# Altium footprint library B-NT_CONNECT.PcbLib: 109 footprints (part 1 of 7)
Each footprint in its own frame and in the unit in brackets; x right, y up, seen from the top. Pads: shape width x height; smd on the part's side, far side on the other; paste and mask are expansions set on the pad; w line width, h text height; cw(c..) or ccw(c..) is an arc to the next point about the centre after c.
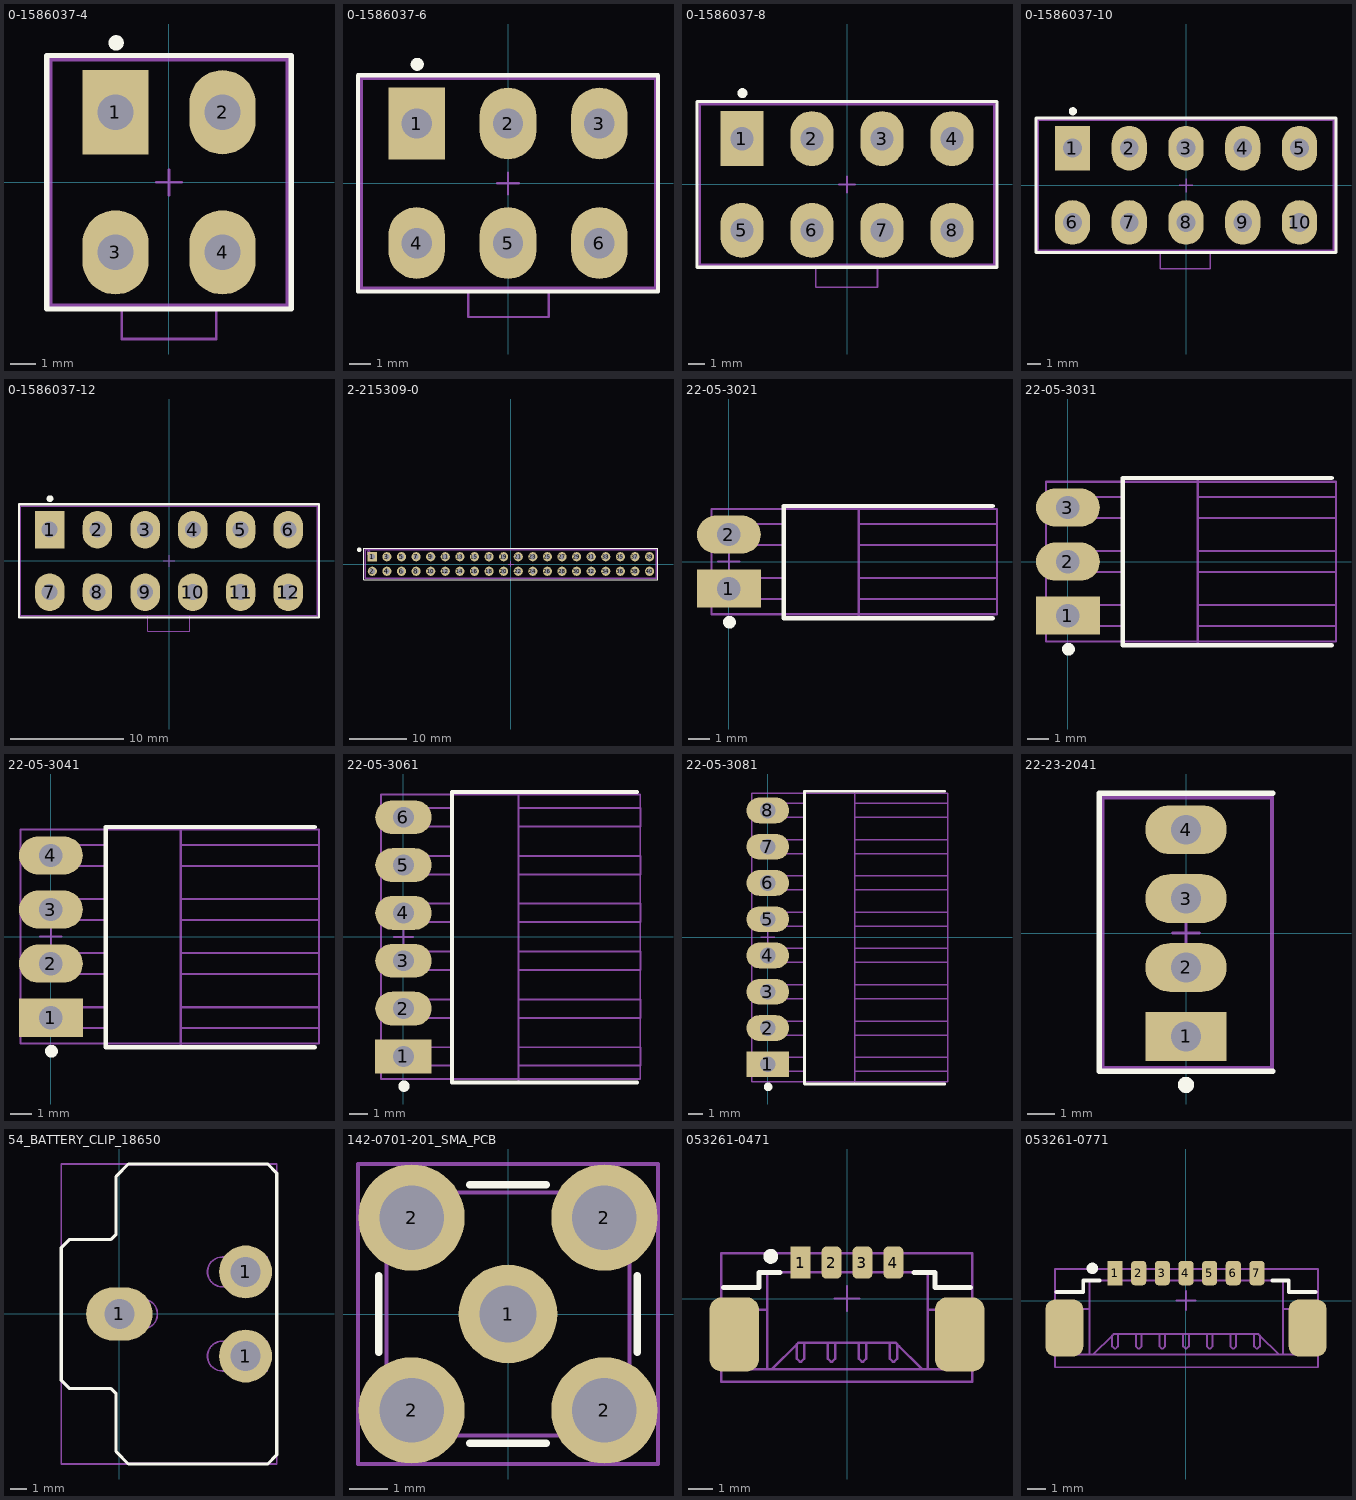
[diagram p0: the footprints below, top view; thin cyan lines are the x and y axes]

## 0-1586037-4 [mm]
height 12.8
pads (4):
  rect 2.6x3.3 hole 1.4: 1(-2.1,2.75)
  oval 2.6x3.3 hole 1.4: 2(2.1,2.75) 3(-2.1,-2.75) 4(2.1,-2.75)
Top Overlay:
  circle w0.3: c-2.075,5.475 r0.15
  lines w0.2: -4.8,-4.975 4.8,-4.975 4.8,4.975 -4.8,4.975 -4.8,-4.975
M3 Top Assy:
  lines w0.1: -1.85,-4.85 -1.85,-6.15 0.425,-6.15 1.85,-6.15 1.85,-4.85 ; -4.675,-4.85 4.675,-4.85 4.675,4.85 -4.675,4.85 -4.675,-4.85 ; -3.065,-3.675 -3.065,-1.825 -1.215,-1.825 -1.215,-3.675 -3.065,-3.675 ; -3.065,1.795 -1.215,1.795 -1.215,3.645 -3.065,3.645 -3.065,1.795 ; -2.365,-2.995 -2.365,-2.495 -1.865,-2.495 -1.865,-2.995 -2.365,-2.995 ; -2.365,2.475 -1.865,2.475 -1.865,2.975 -2.365,2.975 -2.365,2.475 ; 1.15,-3.685 1.15,-1.835 3,-1.835 3,-3.685 1.15,-3.685 ; 1.16,1.82 1.16,3.67 3.01,3.67 3.01,1.82 1.16,1.82 ; 1.85,-3.005 2.35,-3.005 2.35,-2.505 1.85,-2.505 1.85,-3.005 ; 1.86,2.5 1.86,3 2.36,3 2.36,2.5 1.86,2.5
M8 Top Brd Anno:
  lines w0.1: -0.5,0 0.5,0 ; 0,-0.5 0,0.5 ; -4.625,-4.8 -4.625,4.8 4.625,4.8 4.625,-4.8 -4.625,-4.8
3D body "0-1586037-4.STEP": height 12.8, standoff -3.5, extent -4.775,-6.125 4.825,4.925

## 0-1586037-6 [mm]
height 12.8
pads (6):
  rect 2.6x3.3 hole 1.4: 1(-4.2,2.75)
  oval 2.6x3.3 hole 1.4: 2(0,2.75) 3(4.2,2.75) 4(-4.2,-2.75) 5(0,-2.75) 6(4.2,-2.75)
Top Overlay:
  circle w0.3: c-4.175,5.475 r0.15
  lines w0.2: -6.9,-4.975 6.9,-4.975 6.9,4.975 -6.9,4.975 -6.9,-4.975
M3 Top Assy:
  lines w0.1: -1.825,-4.85 -1.825,-6.15 0.45,-6.15 1.875,-6.15 1.875,-4.85 ; -6.775,-4.85 6.825,-4.85 6.825,4.85 -6.775,4.85 -6.775,-4.85 ; -5.165,-3.675 -5.165,-1.825 -3.315,-1.825 -3.315,-3.675 -5.165,-3.675 ; -5.165,1.795 -3.315,1.795 -3.315,3.645 -5.165,3.645 -5.165,1.795 ; -4.465,-2.995 -4.465,-2.495 -3.965,-2.495 -3.965,-2.995 -4.465,-2.995 ; -4.465,2.475 -3.965,2.475 -3.965,2.975 -4.465,2.975 -4.465,2.475 ; -0.95,-3.685 -0.95,-1.835 0.9,-1.835 0.9,-3.685 -0.95,-3.685 ; -0.94,1.82 -0.94,3.67 0.91,3.67 0.91,1.82 -0.94,1.82 ; -0.25,-3.005 0.25,-3.005 0.25,-2.505 -0.25,-2.505 -0.25,-3.005 ; -0.24,2.5 -0.24,3 0.26,3 0.26,2.5 -0.24,2.5 ; 3.25,-3.685 5.1,-3.685 5.1,-1.835 3.25,-1.835 3.25,-3.685 ; 3.26,1.82 5.11,1.82 5.11,3.67 3.26,3.67 3.26,1.82 ; 3.95,-3.005 3.95,-2.505 4.45,-2.505 4.45,-3.005 3.95,-3.005 ; 3.96,2.5 4.46,2.5 4.46,3 3.96,3 3.96,2.5
M8 Top Brd Anno:
  lines w0.1: -0.5,0 0.5,0 ; 0,-0.5 0,0.5 ; -6.725,-4.8 -6.725,4.8 6.775,4.8 6.775,-4.8 -6.725,-4.8
3D body "0-1586037-6.SLDPRT": height 12.8, standoff -3.5, extent -6.9,-6.2 6.9,4.85

## 0-1586037-8 [mm]
height 12.8
pads (8):
  rect 2.6x3.3 hole 1.4: 1(-6.3,2.75)
  oval 2.6x3.3 hole 1.4: 2(-2.1,2.75) 3(2.1,2.75) 4(6.3,2.75) 5(-6.3,-2.75) 6(-2.1,-2.75) 7(2.1,-2.75) 8(6.3,-2.75)
Top Overlay:
  circle w0.3: c-6.275,5.475 r0.15
  lines w0.2: 8.975,4.975 -9,4.975 -9,-4.975 9,-4.975 9,4.975
M3 Top Assy:
  lines w0.1: -1.875,-4.875 -1.875,-6.175 0.4,-6.175 1.825,-6.175 1.825,-4.875 ; 8.925,-4.85 8.925,4.85 ; -8.875,-4.85 -8.875,4.85 8.85,4.85 8.85,-4.85 -8.875,-4.85 ; -7.265,-3.675 -5.415,-3.675 -5.415,-1.825 -7.265,-1.825 -7.265,-3.675 ; -7.265,1.795 -7.265,3.645 -5.415,3.645 -5.415,1.795 -7.265,1.795 ; -6.565,-2.995 -6.065,-2.995 -6.065,-2.495 -6.565,-2.495 -6.565,-2.995 ; -6.565,2.475 -6.565,2.975 -6.065,2.975 -6.065,2.475 -6.565,2.475 ; -3.05,-3.685 -1.2,-3.685 -1.2,-1.835 -3.05,-1.835 -3.05,-3.685 ; -3.04,1.82 -1.19,1.82 -1.19,3.67 -3.04,3.67 -3.04,1.82 ; -2.35,-3.005 -2.35,-2.505 -1.85,-2.505 -1.85,-3.005 -2.35,-3.005 ; -2.34,2.5 -1.84,2.5 -1.84,3 -2.34,3 -2.34,2.5 ; 1.15,-3.685 1.15,-1.835 3,-1.835 3,-3.685 1.15,-3.685 ; 1.16,1.82 1.16,3.67 3.01,3.67 3.01,1.82 1.16,1.82 ; 1.85,-3.005 2.35,-3.005 2.35,-2.505 1.85,-2.505 1.85,-3.005 ; 1.86,2.5 1.86,3 2.36,3 2.36,2.5 1.86,2.5 ; 5.35,-3.685 7.2,-3.685 7.2,-1.835 5.35,-1.835 5.35,-3.685 ; 5.36,1.82 7.21,1.82 7.21,3.67 5.36,3.67 5.36,1.82 ; 6.05,-3.005 6.05,-2.505 6.55,-2.505 6.55,-3.005 6.05,-3.005 ; 6.06,2.5 6.56,2.5 6.56,3 6.06,3 6.06,2.5
M8 Top Brd Anno:
  lines w0.1: -0.5,0 0.5,0 ; 0,-0.5 0,0.5 ; -8.825,-4.8 -8.825,4.8 8.8,4.8 8.8,-4.8 -8.825,-4.8
3D body "0-1586037-8.SLDPRT": height 12.8, standoff -3.5, extent -9,-6.175 9,4.875

## 0-1586037-10 [mm]
height 12.8
pads (10):
  rect 2.6x3.3 hole 1.4: 1(-8.4,2.75)
  oval 2.6x3.3 hole 1.4: 2(-4.2,2.75) 3(0,2.75) 4(4.2,2.75) 5(8.4,2.75) 6(-8.4,-2.75) 7(-4.2,-2.75) 8(0,-2.75) 9(4.2,-2.75) 10(8.4,-2.75)
Top Overlay:
  circle w0.3: c-8.375,5.475 r0.15
  lines w0.2: 11.025,-4.975 -11.1,-4.975 -11.1,4.975 11.075,4.975 ; 11.1,-4.975 11.1,4.975
M3 Top Assy:
  lines w0.1: -1.912,-4.875 -1.912,-6.175 0.363,-6.175 1.788,-6.175 1.788,-4.875 ; 11.025,-4.85 11.025,4.85 ; -10.975,-4.85 -10.975,4.85 10.95,4.85 10.95,-4.85 -10.975,-4.85 ; -9.365,-3.675 -7.515,-3.675 -7.515,-1.825 -9.365,-1.825 -9.365,-3.675 ; -9.365,1.795 -9.365,3.645 -7.515,3.645 -7.515,1.795 -9.365,1.795 ; -8.665,-2.995 -8.165,-2.995 -8.165,-2.495 -8.665,-2.495 -8.665,-2.995 ; -8.665,2.475 -8.665,2.975 -8.165,2.975 -8.165,2.475 -8.665,2.475 ; -5.15,-3.685 -3.3,-3.685 -3.3,-1.835 -5.15,-1.835 -5.15,-3.685 ; -5.14,1.82 -3.29,1.82 -3.29,3.67 -5.14,3.67 -5.14,1.82 ; -4.45,-3.005 -4.45,-2.505 -3.95,-2.505 -3.95,-3.005 -4.45,-3.005 ; -4.44,2.5 -3.94,2.5 -3.94,3 -4.44,3 -4.44,2.5 ; -0.95,-3.685 -0.95,-1.835 0.9,-1.835 0.9,-3.685 -0.95,-3.685 ; -0.94,1.82 -0.94,3.67 0.91,3.67 0.91,1.82 -0.94,1.82 ; -0.25,-3.005 0.25,-3.005 0.25,-2.505 -0.25,-2.505 -0.25,-3.005 ; -0.24,2.5 -0.24,3 0.26,3 0.26,2.5 -0.24,2.5 ; 3.25,-3.685 5.1,-3.685 5.1,-1.835 3.25,-1.835 3.25,-3.685 ; 3.26,1.82 5.11,1.82 5.11,3.67 3.26,3.67 3.26,1.82 ; 3.95,-3.005 3.95,-2.505 4.45,-2.505 4.45,-3.005 3.95,-3.005 ; 3.96,2.5 4.46,2.5 4.46,3 3.96,3 3.96,2.5 ; 7.45,-3.685 7.45,-1.835 9.3,-1.835 9.3,-3.685 7.45,-3.685 ; 7.46,1.82 7.46,3.67 9.31,3.67 9.31,1.82 7.46,1.82 ; 8.15,-3.005 8.65,-3.005 8.65,-2.505 8.15,-2.505 8.15,-3.005 ; 8.16,2.5 8.16,3 8.66,3 8.66,2.5 8.16,2.5
M8 Top Brd Anno:
  lines w0.1: -0.5,0 0.5,0 ; 0,-0.5 0,0.5 ; -10.925,-4.8 10.9,-4.8 10.9,4.8 -10.925,4.8 -10.925,-4.8
3D body "1-1586037-0.SLDPRT": height 12.8, standoff -3.5, extent -11.075,-6.2 11.125,4.85

## 0-1586037-12 [mm]
height 12.8
pads (12):
  rect 2.6x3.3 hole 1.4: 1(-10.5,2.75)
  oval 2.6x3.3 hole 1.4: 2(-6.3,2.75) 3(-2.1,2.75) 4(2.1,2.75) 5(6.3,2.75) 6(10.5,2.75) 7(-10.5,-2.75) 8(-6.3,-2.75) 9(-2.1,-2.75) 10(2.1,-2.75) 11(6.3,-2.75) 12(10.5,-2.75)
Top Overlay:
  circle w0.3: c-10.475,5.475 r0.15
  lines w0.2: -13.2,-4.975 -13.2,4.975 13.2,4.975 13.2,-4.975 -13.2,-4.975
M3 Top Assy:
  lines w0.1: -1.875,-4.875 -1.875,-6.175 0.4,-6.175 1.825,-6.175 1.825,-4.875 ; -13.075,-4.85 -13.075,4.85 13.1,4.85 13.1,-4.85 -13.075,-4.85 ; -11.465,-3.675 -9.615,-3.675 -9.615,-1.825 -11.465,-1.825 -11.465,-3.675 ; -11.465,1.795 -11.465,3.645 -9.615,3.645 -9.615,1.795 -11.465,1.795 ; -10.765,-2.995 -10.265,-2.995 -10.265,-2.495 -10.765,-2.495 -10.765,-2.995 ; -10.765,2.475 -10.765,2.975 -10.265,2.975 -10.265,2.475 -10.765,2.475 ; -7.25,-3.685 -5.4,-3.685 -5.4,-1.835 -7.25,-1.835 -7.25,-3.685 ; -7.24,1.82 -5.39,1.82 -5.39,3.67 -7.24,3.67 -7.24,1.82 ; -6.55,-3.005 -6.55,-2.505 -6.05,-2.505 -6.05,-3.005 -6.55,-3.005 ; -6.54,2.5 -6.04,2.5 -6.04,3 -6.54,3 -6.54,2.5 ; -3.05,-3.685 -3.05,-1.835 -1.2,-1.835 -1.2,-3.685 -3.05,-3.685 ; -3.04,1.82 -3.04,3.67 -1.19,3.67 -1.19,1.82 -3.04,1.82 ; -2.35,-3.005 -1.85,-3.005 -1.85,-2.505 -2.35,-2.505 -2.35,-3.005 ; -2.34,2.5 -2.34,3 -1.84,3 -1.84,2.5 -2.34,2.5 ; 1.15,-3.685 3,-3.685 3,-1.835 1.15,-1.835 1.15,-3.685 ; 1.16,1.82 3.01,1.82 3.01,3.67 1.16,3.67 1.16,1.82 ; 1.85,-3.005 1.85,-2.505 2.35,-2.505 2.35,-3.005 1.85,-3.005 ; 1.86,2.5 2.36,2.5 2.36,3 1.86,3 1.86,2.5 ; 5.35,-3.685 5.35,-1.835 7.2,-1.835 7.2,-3.685 5.35,-3.685 ; 5.36,1.82 5.36,3.67 7.21,3.67 7.21,1.82 5.36,1.82 ; 6.05,-3.005 6.55,-3.005 6.55,-2.505 6.05,-2.505 6.05,-3.005 ; 6.06,2.5 6.06,3 6.56,3 6.56,2.5 6.06,2.5 ; 9.55,-3.685 11.4,-3.685 11.4,-1.835 9.55,-1.835 9.55,-3.685 ; 9.56,1.82 11.41,1.82 11.41,3.67 9.56,3.67 9.56,1.82 ; 10.25,-3.005 10.25,-2.505 10.75,-2.505 10.75,-3.005 10.25,-3.005 ; 10.26,2.5 10.76,2.5 10.76,3 10.26,3 10.26,2.5
M8 Top Brd Anno:
  lines w0.1: -0.5,0 0.5,0 ; 0,-0.5 0,0.5 ; -13.025,-4.8 -13.025,4.8 13.025,4.8 13.025,-4.8 -13.025,-4.8
3D body "1-1586037-2.SLDPRT": height 12.8, standoff -3.5, extent -13.175,-6.175 13.225,4.875

## 2-215309-0 [mm] "Body 5.06x50.8"
height 8.5
pads (40):
  rect 1.6x1.6 hole 0.9: 1(-24.13,1.27)
  round 1.6 hole 0.9: 2(-24.13,-1.27) 3(-21.59,1.27) 4(-21.59,-1.27) 5(-19.05,1.27) 6(-19.05,-1.27) 7(-16.51,1.27) 8(-16.51,-1.27) 9(-13.97,1.27) 10(-13.97,-1.27) 11(-11.43,1.27) 12(-11.43,-1.27) 13(-8.89,1.27) 14(-8.89,-1.27) 15(-6.35,1.27) 16(-6.35,-1.27) 17(-3.81,1.27) 18(-3.81,-1.27) 19(-1.27,1.27) 20(-1.27,-1.27) 21(1.27,1.27) 22(1.27,-1.27) 23(3.81,1.27) 24(3.81,-1.27) 25(6.35,1.27) 26(6.35,-1.27) 27(8.89,1.27) 28(8.89,-1.27) 29(11.43,1.27) 30(11.43,-1.27) 31(13.97,1.27) 32(13.97,-1.27) 33(16.51,1.27) 34(16.51,-1.27) 35(19.05,1.27) 36(19.05,-1.27) 37(21.59,1.27) 38(21.59,-1.27) 39(24.13,1.27) 40(24.13,-1.27)
Top Overlay:
  circle w0.4: c-26.425,2.475 r0.2
  lines w0.2: -25.6,-2.725 25.6,-2.725 25.6,2.725 -25.6,2.725 -25.6,-2.725
Bottom Overlay:
  circle w0.4: c-26.412,2.47 r0.2
M3 Top Assy:
  circle w0.2: c-24.75,1.9 r0.3
  lines w0.2: -25.4,-2.52 25.4,-2.52 25.4,2.54 -25.4,2.54 -25.4,-2.52
M8 Top Brd Anno:
  lines w0.1: -0.5,0 0.5,0 ; 0,-0.5 0,0.5 ; -25.3,-2.425 25.3,-2.425 25.3,2.45 -25.3,2.45 -25.3,-2.425
3D body: height 0.25, standoff 0, extent 24.13,-1.27 24.384,-1.016
3D body "c-2-215309-0-e-3d.stp": height 8.5, standoff -3, extent -25.4,-2.53 25.4,2.53

## 22-05-3021 [mm]
height 6.5
pads (2):
  rect 3x1.8 hole 1.1: 1(0,-1.27)
  oval 3x1.8 hole 1.1: 2(0,1.27)
Top Overlay:
  circle w0.3: c0.025,-2.85 r0.15
  lines w0.2: 12.4,-2.66 2.575,-2.66 2.575,2.61 12.4,2.61
M3 Top Assy:
  lines w0.1: 2.575,-1.76 -0.4,-1.76 -0.4,-0.78 2.575,-0.78 ; 2.575,0.78 -0.4,0.78 -0.4,1.76 2.575,1.76 ; 6.1,-1.76 12.6,-1.76 12.6,-0.78 6.1,-0.78 ; 6.1,0.78 12.6,0.78 12.6,1.76 6.1,1.76 ; 2.575,-2.66 6.1,-2.66 6.1,2.66 2.575,2.66 2.575,-2.66
M8 Top Brd Anno:
  lines w0.1: -0.5,0 0.5,0 ; 0,-0.5 0,0.5 ; -0.825,-2.475 12.6,-2.475 12.6,2.475 -0.825,2.475 -0.825,-2.475
3D body "022053021.STEP": height 6.38, standoff -3.56, extent -0.335,-2.464 12.593,2.464

## 22-05-3031 [mm]
height 6.5
pads (3):
  rect 3x1.8 hole 1.1: 1(0,-2.54)
  oval 3x1.8 hole 1.1: 2(0,0) 3(0,2.54)
Top Overlay:
  circle w0.3: c0.025,-4.12 r0.15
  lines w0.2: 12.4,-3.93 2.575,-3.93 2.575,3.93 12.4,3.93
M3 Top Assy:
  lines w0.1: 2.575,-3.03 -0.4,-3.03 -0.4,-2.05 2.575,-2.05 ; 2.575,-0.49 -0.4,-0.49 -0.4,0.49 2.575,0.49 ; 2.575,2.05 -0.4,2.05 -0.4,3.03 2.575,3.03 ; 6.1,-3.03 12.6,-3.03 12.6,-2.05 6.1,-2.05 ; 6.1,-0.49 12.6,-0.49 12.6,0.49 6.1,0.49 ; 6.1,2.05 12.6,2.05 12.6,3.03 6.1,3.03 ; 2.575,-3.93 2.575,3.93 6.1,3.93 6.1,-3.93 2.575,-3.93
M8 Top Brd Anno:
  lines w0.1: -0.5,0 0.5,0 ; 0,-0.5 0,0.5 ; -1.025,-3.75 -1.025,3.75 12.6,3.75 12.6,-3.75 -1.025,-3.75
3D body "022053031.STEP": height 6.38, standoff -3.56, extent -0.335,-3.734 12.593,3.734

## 22-05-3041 [mm]
height 6.5
pads (4):
  rect 3x1.8 hole 1.1: 1(0,-3.81)
  oval 3x1.8 hole 1.1: 2(0,-1.27) 3(0,1.27) 4(0,3.81)
Top Overlay:
  circle w0.3: c0.025,-5.39 r0.15
  lines w0.2: 12.4,-5.2 2.575,-5.2 2.575,5.15 12.4,5.15
M3 Top Assy:
  lines w0.1: 2.575,-4.3 -0.4,-4.3 -0.4,-3.32 2.575,-3.32 ; 2.575,-1.76 -0.4,-1.76 -0.4,-0.78 2.575,-0.78 ; 2.575,0.78 -0.4,0.78 -0.4,1.76 2.575,1.76 ; 2.575,3.32 -0.4,3.32 -0.4,4.3 2.575,4.3 ; 6.1,-4.3 12.6,-4.3 12.6,-3.32 6.1,-3.32 ; 6.1,-1.76 12.6,-1.76 12.6,-0.78 6.1,-0.78 ; 6.1,0.78 12.6,0.78 12.6,1.76 6.1,1.76 ; 6.1,3.32 12.6,3.32 12.6,4.3 6.1,4.3 ; 2.575,-5.2 2.575,5.2 6.1,5.2 6.1,-5.2 2.575,-5.2
M8 Top Brd Anno:
  lines w0.1: -0.5,0 0.5,0 ; 0,-0.5 0,0.5 ; -1.425,-5.025 12.6,-5.025 12.6,5.025 -1.425,5.025 -1.425,-5.025
3D body "022053041.STEP": height 6.38, standoff -3.56, extent -0.335,-5.004 12.593,5.004

## 22-05-3061 [mm]
height 6.5
pads (6):
  rect 3x1.8 hole 1.1: 1(0,-6.35)
  oval 3x1.8 hole 1.1: 2(0,-3.81) 3(0,-1.27) 4(0,1.27) 5(0,3.81) 6(0,6.35)
Top Overlay:
  circle w0.3: c0.025,-7.93 r0.15
  lines w0.2: 12.4,-7.74 2.575,-7.74 2.575,7.69 12.4,7.69
M3 Top Assy:
  lines w0.1: 2.575,-6.84 -0.4,-6.84 -0.4,-5.86 2.575,-5.86 ; 2.575,-4.3 -0.4,-4.3 -0.4,-3.32 2.575,-3.32 ; 2.575,-1.76 -0.4,-1.76 -0.4,-0.78 2.575,-0.78 ; 2.575,0.78 -0.4,0.78 -0.4,1.76 2.575,1.76 ; 2.575,3.32 -0.4,3.32 -0.4,4.3 2.575,4.3 ; 2.575,5.86 -0.4,5.86 -0.4,6.84 2.575,6.84 ; 6.1,-6.84 12.6,-6.84 12.6,-5.86 6.1,-5.86 ; 6.1,-4.3 12.6,-4.3 12.6,-3.32 6.1,-3.32 ; 6.1,-1.76 12.6,-1.76 12.6,-0.78 6.1,-0.78 ; 6.1,0.78 12.6,0.78 12.6,1.76 6.1,1.76 ; 6.1,3.32 12.6,3.32 12.6,4.3 6.1,4.3 ; 6.1,5.86 12.6,5.86 12.6,6.84 6.1,6.84 ; 2.575,-7.74 2.575,7.74 6.1,7.74 6.1,-7.74 2.575,-7.74
M8 Top Brd Anno:
  lines w0.1: -0.5,0 0.5,0 ; 0,-0.5 0,0.5 ; -1.2,-7.55 12.575,-7.55 12.575,7.55 -1.2,7.55 -1.2,-7.55
3D body "022053061.STEP": height 6.38, standoff -3.56, extent -0.336,-7.544 12.593,7.544

## 22-05-3081 [mm]
height 6.5
pads (8):
  rect 3x1.8 hole 1.1: 1(0,-8.89)
  oval 3x1.8 hole 1.1: 2(0,-6.35) 3(0,-3.81) 4(0,-1.27) 5(0,1.27) 6(0,3.81) 7(0,6.35) 8(0,8.89)
Top Overlay:
  circle w0.3: c0.025,-10.47 r0.15
  lines w0.2: 12.4,-10.28 2.575,-10.28 2.575,10.23 12.4,10.23
M3 Top Assy:
  lines w0.1: 2.575,-9.38 -0.4,-9.38 -0.4,-8.4 2.575,-8.4 ; 2.575,-6.84 -0.4,-6.84 -0.4,-5.86 2.575,-5.86 ; 2.575,-4.3 -0.4,-4.3 -0.4,-3.32 2.575,-3.32 ; 2.575,-1.76 -0.4,-1.76 -0.4,-0.78 2.575,-0.78 ; 2.575,0.78 -0.4,0.78 -0.4,1.76 2.575,1.76 ; 2.575,3.32 -0.4,3.32 -0.4,4.3 2.575,4.3 ; 2.575,5.86 -0.4,5.86 -0.4,6.84 2.575,6.84 ; 2.575,8.4 -0.4,8.4 -0.4,9.38 2.575,9.38 ; 2.575,10.23 2.575,-10.28 6.1,-10.28 6.1,10.28 2.575,10.28 ; 6.1,-9.38 12.6,-9.38 12.6,-8.4 6.1,-8.4 ; 6.1,-6.84 12.6,-6.84 12.6,-5.86 6.1,-5.86 ; 6.1,-4.3 12.6,-4.3 12.6,-3.32 6.1,-3.32 ; 6.1,-1.76 12.6,-1.76 12.6,-0.78 6.1,-0.78 ; 6.1,0.78 12.6,0.78 12.6,1.76 6.1,1.76 ; 6.1,3.32 12.6,3.32 12.6,4.3 6.1,4.3 ; 6.1,5.86 12.6,5.86 12.6,6.84 6.1,6.84 ; 6.1,8.4 12.6,8.4 12.6,9.38 6.1,9.38
M8 Top Brd Anno:
  lines w0.1: -0.5,0 0.5,0 ; 0,-0.5 0,0.5 ; -1.125,-10.1 12.6,-10.1 12.6,10.1 -1.125,10.1 -1.125,-10.1
3D body "022053081.STEP": height 6.38, standoff -3.56, extent -0.335,-10.084 12.593,10.084

## 22-23-2041 [mm]
height 10.67
pads (4):
  rect 3x1.8 hole 1.1: 1(0,-3.81)
  oval 3x1.8 hole 1.1: 2(0,-1.27) 3(0,1.27) 4(0,3.81)
Top Overlay:
  circle w0.3: c0,-5.6 r0.15
  lines w0.2: 3.2,-5.1 -3.2,-5.1 -3.2,5.15 3.2,5.15
M3 Top Assy:
  lines w0.1: -3.1,-5 3.2,-5 3.2,5 -3.1,5 -3.1,-5
M8 Top Brd Anno:
  lines w0.1: -0.5,0 0.5,0 ; 0,-0.5 0,0.5 ; -3.05,-4.95 3.15,-4.95 3.15,4.925 3.15,4.975 -3.05,4.975 -3.05,-4.95
3D body "022232041.stp": height 10.61, standoff -3.61, extent -3.099,-5.004 3.251,5.004
3D body: height 1, standoff -11.5, extent 0,0 0,0

## 54_BATTERY_CLIP_18650 [mm]
pads (3):
  oval 4x3.2 hole 1.8: 1(0,0)
  round 3.2 hole 1.8: 1(7.62,-2.54) 1(7.62,2.54)
Top Overlay:
  lines w0.2: -3.507,-3.993 -3.507,3.993 -3,4.5 -0.5,4.5 -0.2,4.8 -0.2,8.3 0.551,9.051 8.949,9.051 9.5,8.5 9.5,-8.5 8.949,-9.051 0.551,-9.051 -0.2,-8.3 -0.2,-4.8 -0.5,-4.5 -3,-4.5 -3.507,-3.993
M3 Top Assy:
  lines w0.1: -0.8,-0.9 -0.8,0.9 -1.3,0.9 ; 8.4,-1.64 8.4,-3.44 8.92,-3.44 ; 8.4,3.44 8.4,1.64 8.92,1.64 ; -1.3,0 -1.3,-0.9 1.4,-0.9 ccw(c1.4,0) 1.4,0.9 -1.3,0.9 ; -1.3,0 -1.3,0.9 ; -1.3,0 -1.3,0 ; 8.92,-3.44 6.22,-3.44 cw(c6.22,-2.54) 6.22,-1.64 8.92,-1.64 8.92,-2.54 ; 8.92,-3.44 8.92,-2.54 ; 8.92,-2.54 8.92,-2.54 ; 8.92,1.64 6.22,1.64 cw(c6.22,2.54) 6.22,3.44 8.92,3.44 8.92,2.54 ; 8.92,1.64 8.92,2.54 ; 8.92,2.54 8.92,2.54 ; -3.507,-3.993 -3,-4.5 -0.5,-4.5 -0.2,-4.8 -0.2,-8.3 0.5,-9 9,-9 9.5,-8.5 9.5,8.5 9,9 0.5,9 -0.2,8.3 -0.2,4.8 -0.5,4.5 -3,4.5 -3.507,3.993 -3.507,-3.993
M8 Top Brd Anno:
  lines w0.1: -0.5,0 0.5,0 ; 0,-0.5 0,0.5 ; -3.5,-9.05 -3.5,9.05 9.5,9.05 9.5,-9.05 -3.5,-9.05
3D body "keystone-PN54.STEP": height 18.4, standoff -2.95, extent -3.507,-9.051 9.5,9.051

## 142-0701-201_SMA_PCB [mm] "SMA CONN PCB CINCH 142-0701-201"
height 9.52
pads (5):
  round 2.6 hole 1.5: 1(0,0)
  round 2.8 hole 1.7: 2(-2.54,-2.54) 2(-2.54,2.54) 2(2.54,-2.54) 2(2.54,2.54)
Top Overlay:
  lines w0.2: -3.4,-1 -3.4,1 ; -1,-3.4 1,-3.4 ; -1,3.4 1,3.4 ; 3.4,-1 3.4,1
M3 Top Assy:
  lines w0.1: -3.2,-3.2 -3.2,3.2 3.2,3.2 3.2,-3.2 -3.2,-3.2
M8 Top Brd Anno:
  lines w0.1: -0.5,0 0.5,0 ; 0,-0.5 0,0.5 ; -3.95,-3.95 -3.95,3.95 3.95,3.95 3.95,-3.95 -3.95,-3.95
3D body "body.STEP": height 9.22, standoff -3.99, extent -3.962,-3.962 3.963,3.962

## 053261-0471 [mm]
pads (6):
  rect 0.8x1.3 smd: 1(-1.875,1.45)
  rrect50% 0.8x1.3 smd: 2(-0.625,1.45) 3(0.625,1.45) 4(1.875,1.45)
  rrect50% 2x3 smd: ""(-4.55,-1.45) ""(4.55,-1.45)
Top Overlay:
  circle w0.3: c-3.075,1.7 r0.15
  lines w0.2: -4.975,0.45 -3.55,0.45 -3.55,1.05 -2.7,1.05 ; 2.7,1.05 3.55,1.05 3.55,0.45 4.975,0.45
M3 Top Assy:
  lines w0.1: -3.225,-0.45 -4.725,-0.45 -4.725,-2.85 ; -3.025,-2.85 -2.025,-1.85 ; -2.025,1.05 -2.025,1.55 -1.725,1.55 -1.725,1.05 ; -1.9,-2.55 -2.025,-2.425 ; -1.85,-2.55 -1.725,-2.425 -1.725,-1.775 ; -0.775,-1.775 -0.775,-2.425 ; -0.775,1.05 -0.775,1.55 -0.475,1.55 -0.475,1.05 ; -0.65,-2.55 -0.775,-2.425 ; -0.6,-2.55 -0.475,-2.425 -0.475,-1.775 ; 0.475,-1.775 0.475,-2.425 ; 0.6,-2.55 0.475,-2.425 ; 0.65,-2.55 0.775,-2.425 0.775,-1.775 ; 1.725,-1.775 1.725,-2.425 ; 1.85,-2.55 1.725,-2.425 ; 1.9,-2.55 2.025,-2.425 2.025,-1.85 3.025,-2.85 ; 2.1,-1.925 1.95,-1.775 -1.95,-1.775 -2.025,-1.85 ; 3.25,-0.45 4.675,-0.45 4.675,-2.85 3.225,-2.85 ; -4.725,-2.85 3.225,-2.85 ; -4.725,-2.85 -3.225,-2.85 -3.225,1.05 3.25,1.05 3.25,-2.825 3.225,-2.85 ; -2.025,-2.425 -2.025,-2.425 ; -2.025,-2.425 -2.025,-1.85 ; -2.025,-1.85 -2.025,-1.85 ; -0.775,-2.425 -0.775,-2.425 ; 0.475,-2.425 0.475,-2.425 ; 0.475,1.55 0.475,1.05 0.475,1.55 ; 0.475,1.55 0.775,1.55 ; 0.475,1.55 0.775,1.55 ; 0.775,1.55 0.775,1.05 0.775,1.55 ; 1.725,-2.425 1.725,-2.425 ; 1.725,1.55 1.725,1.05 1.725,1.55 ; 1.725,1.55 2.025,1.55 ; 1.725,1.55 2.025,1.55 ; 2.025,1.55 2.025,1.05 2.025,1.55
M8 Top Brd Anno:
  lines w0.1: -0.5,0 0.5,0 ; 0,-0.5 0,0.5 ; 5.05,1.825 -5.075,1.825 -5.075,-3.35 5.05,-3.35 5.05,1.825 ; 5.05,1.825 5.05,1.825
3D body "0471.STEP": height 3.4, standoff 0, extent -5.075,-3.375 5.075,1.825

## 053261-0771 [mm]
pads (9):
  rect 0.8x1.3 smd: 1(-3.75,1.45)
  rrect50% 0.8x1.3 smd: 2(-2.5,1.45) 3(-1.25,1.45) 4(0,1.45) 5(1.25,1.45) 6(2.5,1.45) 7(3.75,1.45)
  rrect50% 2x3 smd: ""(-6.425,-1.45) ""(6.425,-1.45)
Top Overlay:
  circle w0.3: c-4.95,1.7 r0.15
  lines w0.2: -6.85,0.45 -5.425,0.45 -5.425,1.05 -4.575,1.05 ; 4.575,1.05 5.425,1.05 5.425,0.45 6.85,0.45
M3 Top Assy:
  lines w0.1: -5.1,-0.45 -6.6,-0.45 -6.6,-2.85 ; -4.9,-2.85 -3.9,-1.85 ; -3.9,1.05 -3.9,1.55 -3.6,1.55 -3.6,1.05 ; -3.775,-2.55 -3.9,-2.425 ; -3.725,-2.55 -3.6,-2.425 -3.6,-1.775 ; -2.65,-1.775 -2.65,-2.425 ; -2.65,1.05 -2.65,1.55 -2.35,1.55 -2.35,1.05 ; -2.525,-2.55 -2.65,-2.425 ; -2.475,-2.55 -2.35,-2.425 -2.35,-1.775 ; -1.4,-1.775 -1.4,-2.425 ; -1.4,1.05 -1.4,1.55 -1.1,1.55 -1.1,1.05 ; -1.275,-2.55 -1.4,-2.425 ; -1.225,-2.55 -1.1,-2.425 -1.1,-1.775 ; -0.15,-1.775 -0.15,-2.425 ; -0.15,1.05 -0.15,1.55 0.15,1.55 0.15,1.05 ; -0.025,-2.55 -0.15,-2.425 ; 0.025,-2.55 0.15,-2.425 0.15,-1.775 ; 1.1,-1.775 1.1,-2.425 ; 1.1,1.05 1.1,1.55 1.4,1.55 1.4,1.05 ; 1.225,-2.55 1.1,-2.425 ; 1.275,-2.55 1.4,-2.425 1.4,-1.775 ; 2.35,-1.775 2.35,-2.425 ; 2.475,-2.55 2.35,-2.425 ; 2.525,-2.55 2.65,-2.425 2.65,-1.775 ; 3.6,-1.775 3.6,-2.425 ; 3.725,-2.55 3.6,-2.425 ; 3.775,-2.55 3.9,-2.425 3.9,-1.85 ; 4.9,-2.85 3.9,-1.85 ; 5.125,-0.45 6.55,-0.45 6.55,-2.85 5.1,-2.85 ; -6.6,-2.85 -5.1,-2.85 -5.1,1.05 1.375,1.05 5.125,1.05 5.125,-2.825 5.1,-2.85 ; -6.6,-2.85 1.35,-2.85 5.1,-2.85 ; -3.9,-2.425 -3.9,-1.85 ; -3.9,-2.425 -3.9,-2.425 ; -3.9,-1.85 -3.9,-1.85 ; -3.9,-1.85 -3.825,-1.775 0.075,-1.775 3.825,-1.775 3.9,-1.85 ; -2.65,-2.425 -2.65,-2.425 ; -1.4,-2.425 -1.4,-2.425 ; -0.15,-2.425 -0.15,-2.425 ; 1.1,-2.425 1.1,-2.425 ; 2.35,-2.425 2.35,-2.425 ; 2.35,1.55 2.35,1.05 2.35,1.55 ; 2.35,1.55 2.65,1.55 ; 2.35,1.55 2.65,1.55 ; 2.65,1.55 2.65,1.05 2.65,1.55 ; 3.6,-2.425 3.6,-2.425 ; 3.6,1.55 3.6,1.05 3.6,1.55 ; 3.6,1.55 3.9,1.55 ; 3.6,1.55 3.9,1.55 ; 3.9,1.55 3.9,1.05 3.9,1.55
M8 Top Brd Anno:
  lines w0.1: -0.5,0 0.5,0 ; 0,-0.5 0,0.5 ; -6.925,-3.525 6.975,-3.525 6.975,1.675 -6.925,1.675 -6.925,-3.525
3D body "532610771.stp": height 3.4, standoff 0, extent -6.925,-3.525 6.975,1.675